# Altium footprint library AltiumDesignerLibraries.PcbLib: 313 footprints (part 8 of 20)
Each footprint in its own frame and in the unit in brackets; x right, y up, seen from the top. Pads: shape width x height; smd on the part's side, far side on the other; paste and mask are expansions set on the pad; w line width, h text height; cw(c..) or ccw(c..) is an arc to the next point about the centre after c.
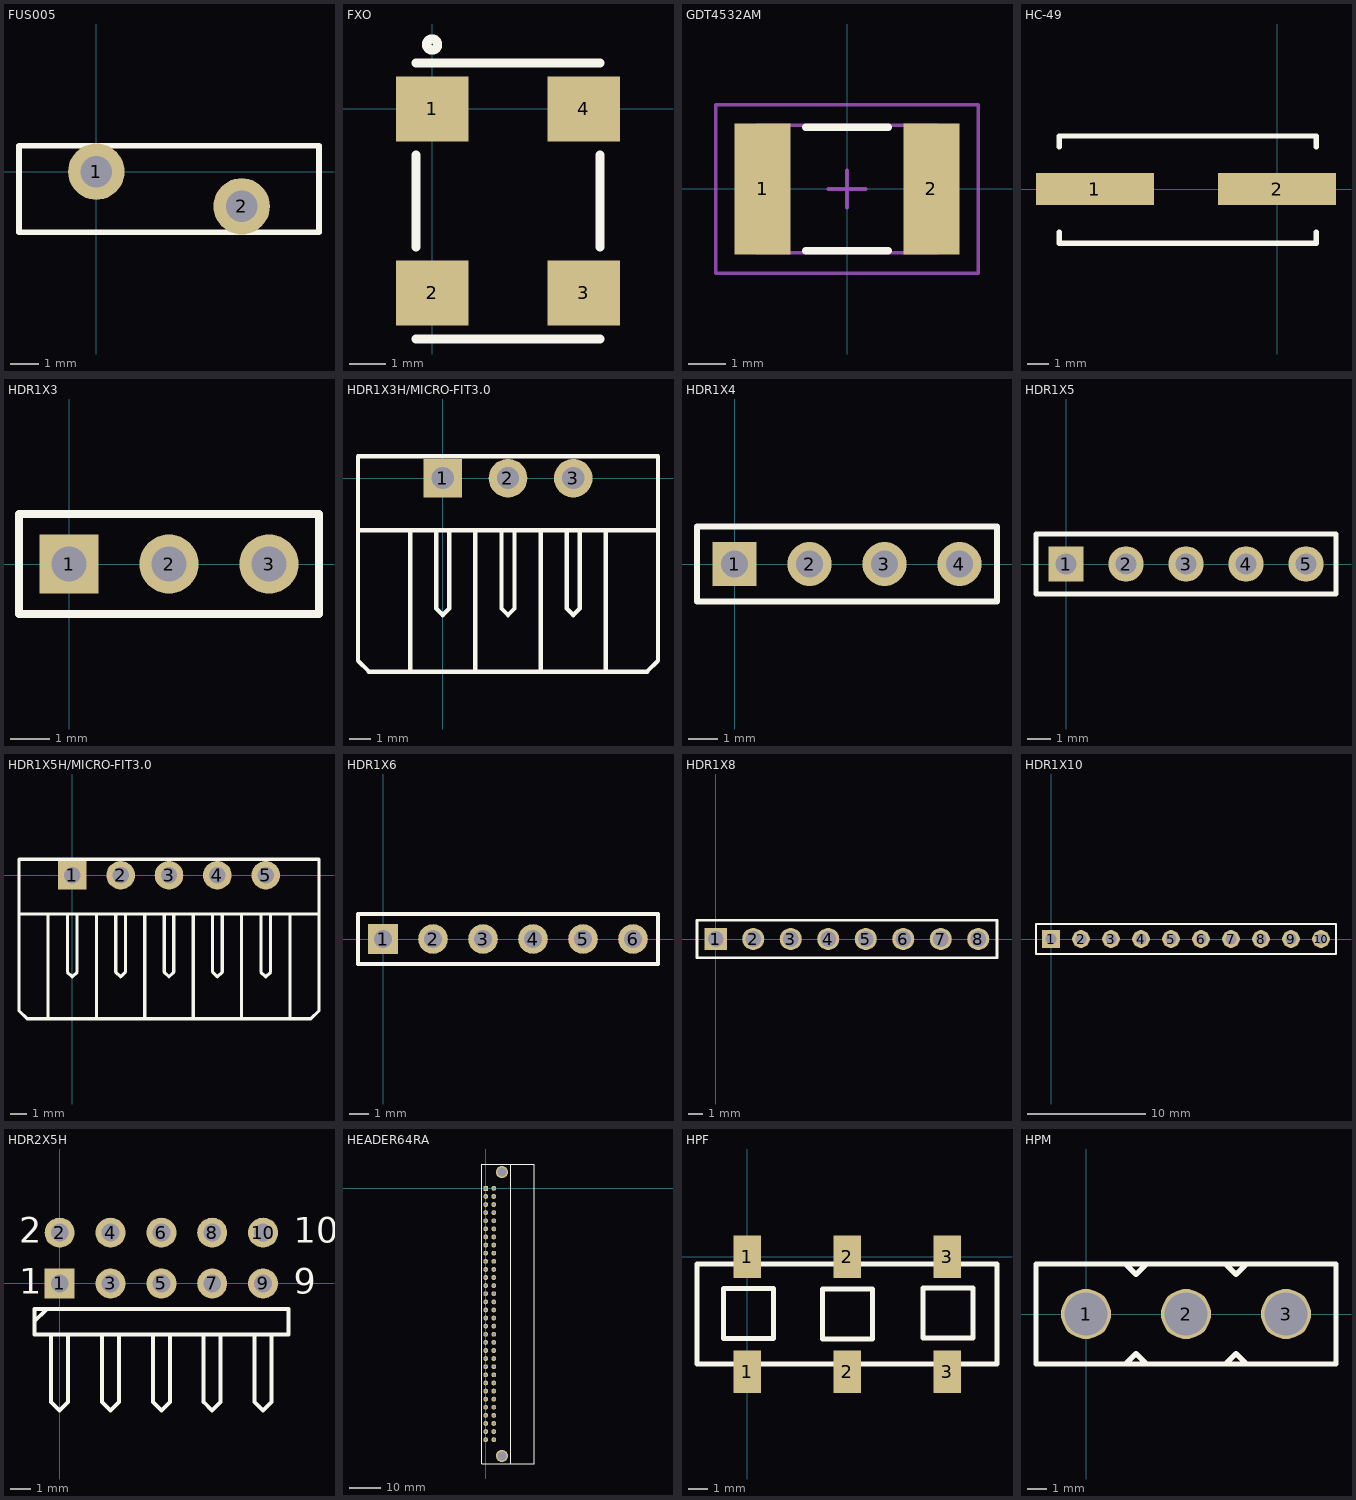
[diagram p7: the footprints below, top view; thin cyan lines are the x and y axes]

## FUS005 [mil]
height 118.11
pads (2):
  round 77 hole 43 mask+3: 1(0,0) 2(198.43,-47.24)
Top Overlay:
  lines w8: -105.51,-82.68 303.94,-82.68 303.94,35.43 -105.51,35.43 -105.51,-82.68

## FXO [mm]
height 1.397
pads (4):
  rect 2x1.8 smd: 1(0,0)
  rect 2x1.798 smd: 2(0,-5.08) 3(4.191,-5.08) 4(4.191,0)
Top Overlay:
  circle w0.254: c0,1.778 r0.152
  lines w0.254: -0.445,-6.35 4.635,-6.35 ; -0.445,-3.81 -0.445,-1.27 ; -0.445,1.27 4.635,1.27 ; 4.635,-3.81 4.635,-1.27

## GDT4532AM [mm] "Chip GDT Body 4.5x3.2mm"
height 0.7
pads (2):
  rect 1.5x3.5 smd: 1(-2.25,0) 2(2.25,0)
Top Overlay:
  lines w0.2: -1.1,-1.65 1.1,-1.65 ; -1.1,1.65 1.1,1.65
Mechanical 13:
  lines w0.1: -2.4,-1.7 -2.4,1.7 2.4,1.7 2.4,-1.7 -2.4,-1.7
Mechanical 15:
  lines w0.1: -0.5,0 0.5,0 ; 0,-0.5 0,0.5 ; -3.5,-2.25 -3.5,2.25 3.5,2.25 3.5,-2.25 -3.5,-2.25
3D body: height 0.7, standoff 0, extent -2.4,-1.7 2.4,1.7

## HC-49 [mm]
pads (2):
  rect 5.5x1.5 smd: 1(-8.5,0) 2(0,0)
Top Overlay:
  lines w0.254: -10.174,-2.025 -10.174,-2.525 1.826,-2.525 1.826,-2.025 ; -10.174,1.975 -10.174,2.475 1.826,2.475 1.826,1.975

## HDR1X3 [mm] "Connector; Header; 3 Position"
pads (3):
  rect 1.5x1.5 hole 0.9: 1(0,0)
  round 1.5 hole 0.9: 2(2.54,0) 3(5.08,0)
Top Overlay:
  lines w0.2: -1.27,-1.27 6.35,-1.27 6.35,1.27 -1.27,1.27 -1.27,-1.27

## HDR1X3H/MICRO-FIT3.0 [mil] "MOLEX 3.00mm (.118\") Pitch Micro-Fit 3.0 Header, Single Row, Right Angle"
height 120
pads (3):
  rect 70x70 hole 40: 1(0,0)
  round 70 hole 40: 2(118.11,0) 3(236.22,0)
Top Overlay:
  lines w7.87: -59.06,-350.39 -59.06,-94.49 ; -11.81,-94.49 -11.81,-236.22 0,-248.03 11.81,-236.22 11.81,-94.49 ; 59.06,-350.39 59.06,-94.49 ; 106.3,-94.49 106.3,-236.22 118.11,-248.03 129.92,-236.22 129.92,-94.49 ; 177.17,-350.39 177.17,-94.49 ; 224.41,-94.49 224.41,-236.22 236.22,-248.03 248.03,-236.22 248.03,-94.49 ; 295.28,-350.39 295.28,-94.49 ; -153.54,-94.49 -153.54,-330.71 -133.86,-350.39 370.08,-350.39 389.76,-330.71 389.76,-94.49 ; -153.54,-94.49 389.76,-94.49 ; -153.54,-94.49 -153.54,39.37 389.76,39.37 389.76,-94.49

## HDR1X4 [mm] "Connector; Header; 4 Position"
pads (4):
  rect 1.5x1.5 hole 0.9: 1(0,0)
  round 1.5 hole 0.9: 2(2.54,0) 3(5.08,0) 4(7.62,0)
Top Overlay:
  lines w0.2: -1.27,-1.27 -1.27,1.27 8.89,1.27 8.89,-1.27 -1.27,-1.27

## HDR1X5 [mm] "Connector; Header; 5 Position"
pads (5):
  rect 1.5x1.5 hole 0.9: 1(0,0)
  round 1.5 hole 0.9: 2(2.54,0) 3(5.08,0) 4(7.62,0) 5(10.16,0)
Top Overlay:
  lines w0.2: -1.27,-1.27 -1.27,1.27 11.43,1.27 11.43,-1.27 -1.27,-1.27

## HDR1X5H/MICRO-FIT3.0 [mil] "MOLEX 3.00mm (.118\") Pitch Micro-Fit 3.0 Header, Single Row, Right Angle"
height 120
pads (5):
  rect 70x70 hole 40: 1(0,0)
  round 70 hole 40: 2(118.11,0) 3(236.22,0) 4(354.33,0) 5(472.44,0)
Top Overlay:
  lines w7.87: -59.06,-350.39 -59.06,-94.49 ; -11.81,-94.49 -11.81,-236.22 0,-248.03 11.81,-236.22 11.81,-100 ; 59.06,-350.39 59.06,-94.49 ; 106.3,-100 106.3,-236.22 118.11,-248.03 129.92,-236.22 129.92,-100 ; 177.17,-350.39 177.17,-94.49 ; 224.41,-94.49 224.41,-236.22 236.22,-248.03 248.03,-236.22 248.03,-94.49 ; 295.28,-350.39 295.28,-94.49 ; 342.52,-94.49 342.52,-236.22 354.33,-248.03 366.14,-236.22 366.14,-94.49 ; 413.39,-350.39 413.39,-94.49 ; 460.63,-94.49 460.63,-236.22 472.44,-248.03 484.25,-236.22 484.25,-94.49 ; 531.5,-350.39 531.5,-94.49 ; -129.92,-94.49 -129.92,39.37 602.36,39.37 602.36,-94.49 ; -129.92,-94.49 602.36,-94.49 ; -129.92,-94.49 -129.92,-330.71 -110.24,-350.39 582.68,-350.39 602.36,-330.71 602.36,-94.49

## HDR1X6 [mm] "Connector; Header; 6 Position"
pads (6):
  rect 1.5x1.5 hole 0.9: 1(0,0)
  round 1.5 hole 0.9: 2(2.54,0) 3(5.08,0) 4(7.62,0) 5(10.16,0) 6(12.7,0)
Top Overlay:
  lines w0.2: -1.27,-1.27 -1.27,1.27 13.97,1.27 13.97,-1.27 -1.27,-1.27

## HDR1X8 [mm] "Connector; Header; 8 Position"
pads (8):
  rect 1.5x1.5 hole 1.067: 1(0,0)
  round 1.5 hole 1.067: 2(2.54,0) 3(5.08,0) 4(7.62,0) 5(10.16,0) 6(12.7,0) 7(15.24,0) 8(17.78,0)
Top Overlay:
  lines w0.2: -1.27,-1.27 -1.27,1.27 19.05,1.27 19.05,-1.27 -1.27,-1.27

## HDR1X10 [mm] "Connector; Header; 10 Position"
pads (10):
  rect 1.5x1.5 hole 0.9: 1(0,0)
  round 1.5 hole 0.9: 2(2.54,0) 3(5.08,0) 4(7.62,0) 5(10.16,0) 6(12.7,0) 7(15.24,0) 8(17.78,0) 9(20.32,0) 10(22.86,0)
Top Overlay:
  lines w0.2: -1.27,-1.27 -1.27,1.27 0.635,1.27 24.13,1.27 24.13,-1.27 -1.27,-1.27

## HDR2X5H [mm]
pads (10):
  rect 1.5x1.5 hole 0.889: 1(0,0)
  round 1.5 hole 0.889: 2(0,2.54) 3(2.54,0) 4(2.54,2.54) 5(5.08,0) 6(5.08,2.54) 7(7.62,0) 8(7.62,2.54) 9(10.16,0) 10(10.16,2.54)
Top Overlay:
  lines w0.2: -1.27,-1.905 -0.635,-1.27 ; -0.423,-2.54 -0.423,-5.927 0,-6.35 0.423,-5.927 0.423,-2.54 ; 2.117,-2.54 2.117,-5.927 2.54,-6.35 2.963,-5.927 2.963,-2.54 ; 4.657,-2.54 4.657,-5.927 5.08,-6.35 5.503,-5.927 5.503,-2.54 ; 7.197,-2.54 7.197,-5.927 7.62,-6.35 8.043,-5.927 8.043,-2.54 ; 9.737,-2.54 9.737,-5.927 10.16,-6.35 10.583,-5.927 10.583,-2.54 ; -1.27,-2.54 11.43,-2.54 11.43,-1.27 -1.27,-1.27 -1.27,-2.54
  text "2" at -2.032,2.032 h1.27
  text "1" at -2.032,-0.508 h1.27
  text "9" at 11.684,-0.508 h1.27
  text "10" at 11.684,2.032 h1.27

## HEADER64RA [mil]
pads (66):
  rect 60x60 hole 38: 1(0,0)
  round 60 hole 38: 2(0,-100) 3(0,-200) 4(0,-300) 5(0,-400) 6(0,-500) 7(0,-600) 8(0,-700) 9(0,-800) 10(0,-900) 11(0,-1000) 12(0,-1100) 13(0,-1200) 14(0,-1300) 15(0,-1400) 16(0,-1500) 17(0,-1600) 18(0,-1700) 19(0,-1800) 20(0,-1900) 21(0,-2000) 22(0,-2100) 23(0,-2200) 24(0,-2300) 25(0,-2400) 26(0,-2500) 27(0,-2600) 28(0,-2700) 29(0,-2800) 30(0,-2900) 31(0,-3000) 32(0,-3100) 33(100,0) 34(100,-100) 35(100,-200) 36(100,-300) 37(100,-400) 38(100,-500) 39(100,-600) 40(100,-700) 41(100,-800) 42(100,-900) 43(100,-1000) 44(100,-1100) 45(100,-1200) 46(100,-1300) 47(100,-1400) 48(100,-1500) 49(100,-1600) 50(100,-1700) 51(100,-1800) 52(100,-1900) 53(100,-2000) 54(100,-2100) 55(100,-2200) 56(100,-2300) 57(100,-2400) 58(100,-2500) 59(100,-2600) 60(100,-2700) 61(100,-2800) 62(100,-2900) 63(100,-3000) 64(100,-3100)
  round 150 hole 110: SYSPAD65(200,200) SYSPAD66(200,-3300)
Top Overlay:
  lines w10: 310,-3400 310,300 ; -50,-3400 600,-3400 600,300 -50,300 -50,-3400

## HPF [mil]
pads (6):
  rect 55x85 smd: 1(0,-230) 1(0,0) 2(200,-230) 2(200,0) 3(400,-230) 3(400,0)
Top Overlay:
  lines w10: -100,-215 500,-215 500,-15 -100,-15 -100,-215 ; -47,-164 53,-164 53,-64 -47,-64 -47,-164 ; 151,-164.5 251,-164.5 251,-64.5 151,-64.5 151,-164.5 ; 351.5,-162.5 451.5,-162.5 451.5,-62.5 351.5,-62.5 351.5,-162.5

## HPM [mil] "HPM series from Samtec 200mil center spacing"
pads (3):
  round 100 hole 86: 1(0,0) 2(200,0) 3(400,0)
Top Overlay:
  lines w10: 79,-100 100,-79 121,-100 ; 79,100 100,79 121,100 ; 279,-100 300,-79 321,-100 ; 279,100 300,79 321,100 ; -100,-100 500,-100 500,100 -100,100 -100,-100